# Altium footprint library MyPcbLib.PcbLib: 222 footprints (part 3 of 14)
Each footprint in its own frame and in the unit in brackets; x right, y up, seen from the top. Pads: shape width x height; smd on the part's side, far side on the other; paste and mask are expansions set on the pad; w line width, h text height; cw(c..) or ccw(c..) is an arc to the next point about the centre after c.
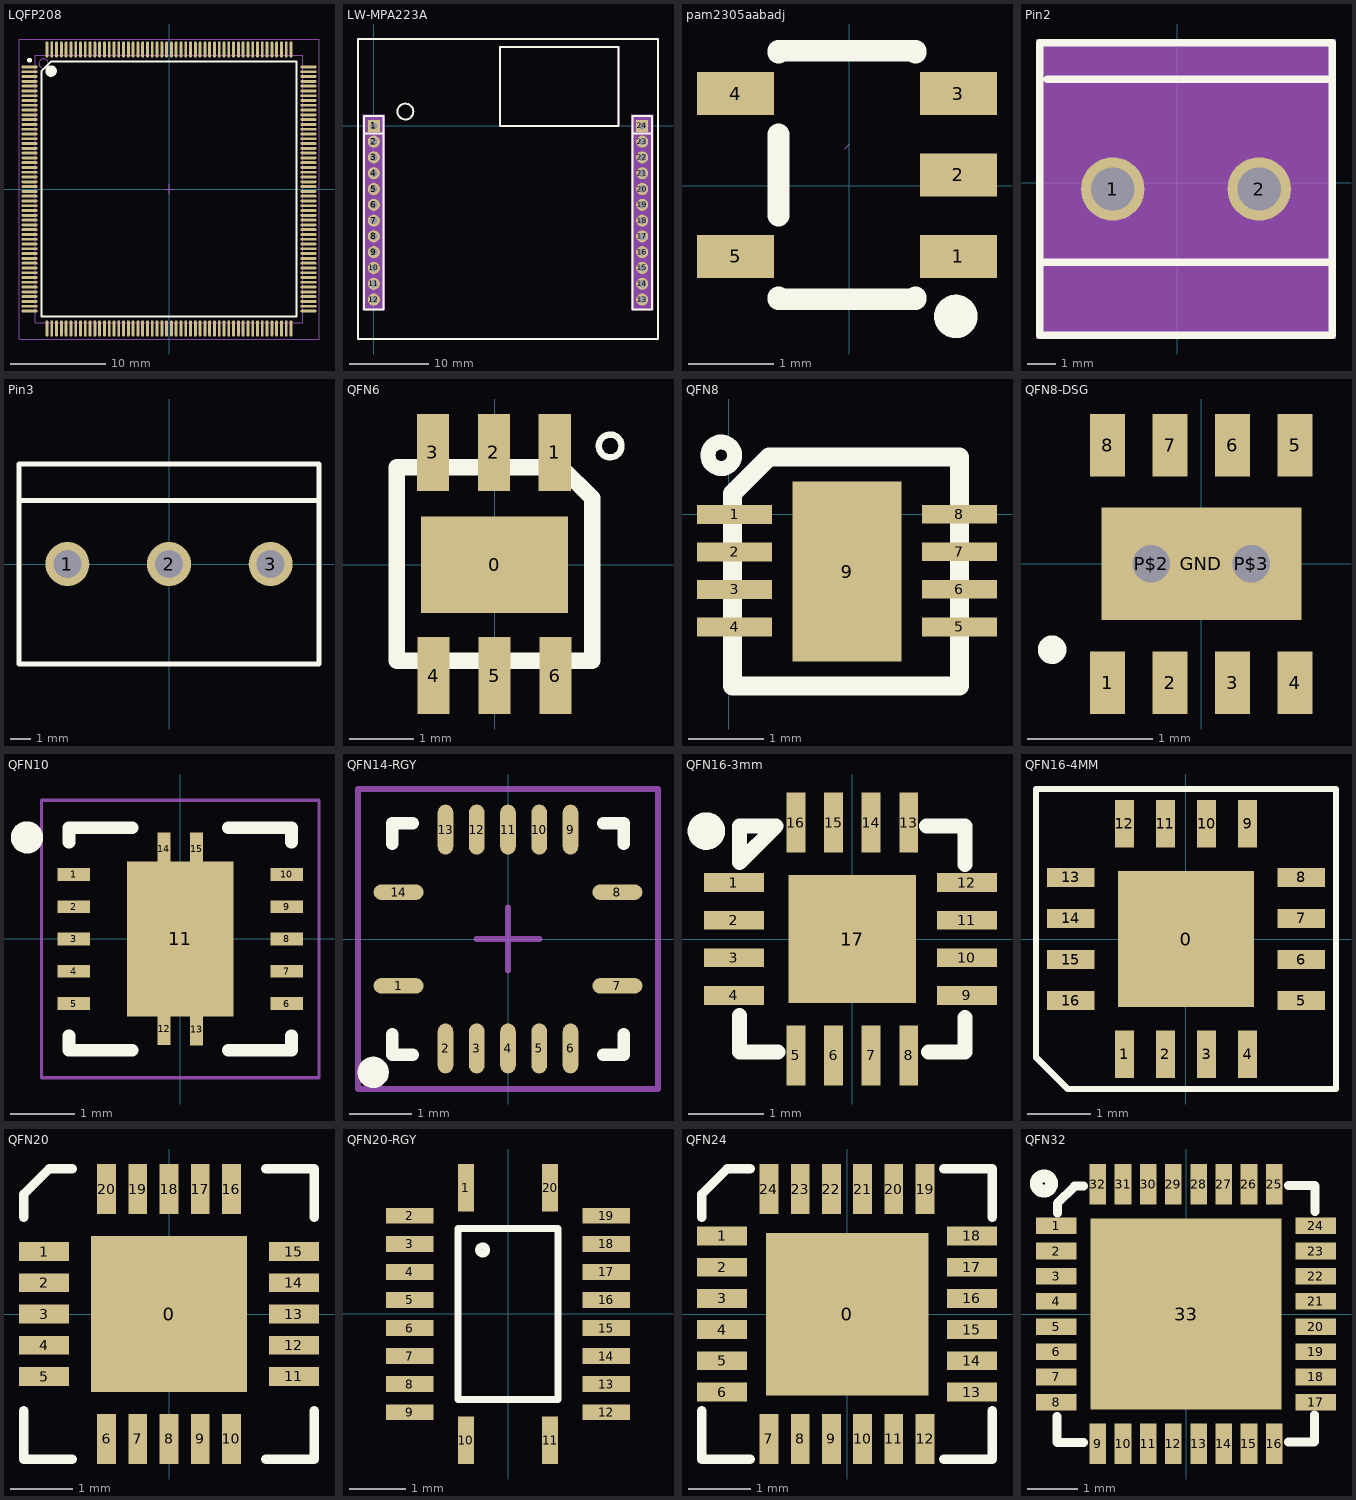
[diagram p2: the footprints below, top view; thin cyan lines are the x and y axes]

## LQFP208 [mm] "TSQFP, 208-Leads, Body 28.00x28.00mm, Pitch 0.50mm, IPC Medium Density"
height 1.6
pads (208):
  oval 1.7x0.3 smd: 1(-14.575,12.75) 2(-14.575,12.25) 3(-14.575,11.75) 4(-14.575,11.25) 5(-14.575,10.75) 6(-14.575,10.25) 7(-14.575,9.75) 8(-14.575,9.25) 9(-14.575,8.75) 10(-14.575,8.25) 11(-14.575,7.75) 12(-14.575,7.25) 13(-14.575,6.75) 14(-14.575,6.25) 15(-14.575,5.75) 16(-14.575,5.25) 17(-14.575,4.75) 18(-14.575,4.25) 19(-14.575,3.75) 20(-14.575,3.25) 21(-14.575,2.75) 22(-14.575,2.25) 23(-14.575,1.75) 24(-14.575,1.25) 25(-14.575,0.75) 26(-14.575,0.25) 27(-14.575,-0.25) 28(-14.575,-0.75) 29(-14.575,-1.25) 30(-14.575,-1.75) 31(-14.575,-2.25) 32(-14.575,-2.75) 33(-14.575,-3.25) 34(-14.575,-3.75) 35(-14.575,-4.25) 36(-14.575,-4.75) 37(-14.575,-5.25) 38(-14.575,-5.75) 39(-14.575,-6.25) 40(-14.575,-6.75) 41(-14.575,-7.25) 42(-14.575,-7.75) 43(-14.575,-8.25) 44(-14.575,-8.75) 45(-14.575,-9.25) 46(-14.575,-9.75) 47(-14.575,-10.25) 48(-14.575,-10.75) 49(-14.575,-11.25) 50(-14.575,-11.75) 51(-14.575,-12.25) 52(-14.575,-12.75) 105(14.575,-12.75) 106(14.575,-12.25) 107(14.575,-11.75) 108(14.575,-11.25) 109(14.575,-10.75) 110(14.575,-10.25) 111(14.575,-9.75) 112(14.575,-9.25) 113(14.575,-8.75) 114(14.575,-8.25) 115(14.575,-7.75) 116(14.575,-7.25) 117(14.575,-6.75) 118(14.575,-6.25) 119(14.575,-5.75) 120(14.575,-5.25) 121(14.575,-4.75) 122(14.575,-4.25) 123(14.575,-3.75) 124(14.575,-3.25) 125(14.575,-2.75) 126(14.575,-2.25) 127(14.575,-1.75) 128(14.575,-1.25) 129(14.575,-0.75) 130(14.575,-0.25) 131(14.575,0.25) 132(14.575,0.75) 133(14.575,1.25) 134(14.575,1.75) 135(14.575,2.25) 136(14.575,2.75) 137(14.575,3.25) 138(14.575,3.75) 139(14.575,4.25) 140(14.575,4.75) 141(14.575,5.25) 142(14.575,5.75) 143(14.575,6.25) 144(14.575,6.75) 145(14.575,7.25) 146(14.575,7.75) 147(14.575,8.25) 148(14.575,8.75) 149(14.575,9.25) 150(14.575,9.75) 151(14.575,10.25) 152(14.575,10.75) 153(14.575,11.25) 154(14.575,11.75) 155(14.575,12.25) 156(14.575,12.75)
  oval 0.3x1.7 smd: 53(-12.75,-14.575) 54(-12.25,-14.575) 55(-11.75,-14.575) 56(-11.25,-14.575) 57(-10.75,-14.575) 58(-10.25,-14.575) 59(-9.75,-14.575) 60(-9.25,-14.575) 61(-8.75,-14.575) 62(-8.25,-14.575) 63(-7.75,-14.575) 64(-7.25,-14.575) 65(-6.75,-14.575) 66(-6.25,-14.575) 67(-5.75,-14.575) 68(-5.25,-14.575) 69(-4.75,-14.575) 70(-4.25,-14.575) 71(-3.75,-14.575) 72(-3.25,-14.575) 73(-2.75,-14.575) 74(-2.25,-14.575) 75(-1.75,-14.575) 76(-1.25,-14.575) 77(-0.75,-14.575) 78(-0.25,-14.575) 79(0.25,-14.575) 80(0.75,-14.575) 81(1.25,-14.575) 82(1.75,-14.575) 83(2.25,-14.575) 84(2.75,-14.575) 85(3.25,-14.575) 86(3.75,-14.575) 87(4.25,-14.575) 88(4.75,-14.575) 89(5.25,-14.575) 90(5.75,-14.575) 91(6.25,-14.575) 92(6.75,-14.575) 93(7.25,-14.575) 94(7.75,-14.575) 95(8.25,-14.575) 96(8.75,-14.575) 97(9.25,-14.575) 98(9.75,-14.575) 99(10.25,-14.575) 100(10.75,-14.575) 101(11.25,-14.575) 102(11.75,-14.575) 103(12.25,-14.575) 104(12.75,-14.575) 157(12.75,14.575) 158(12.25,14.575) 159(11.75,14.575) 160(11.25,14.575) 161(10.75,14.575) 162(10.25,14.575) 163(9.75,14.575) 164(9.25,14.575) 165(8.75,14.575) 166(8.25,14.575) 167(7.75,14.575) 168(7.25,14.575) 169(6.75,14.575) 170(6.25,14.575) 171(5.75,14.575) 172(5.25,14.575) 173(4.75,14.575) 174(4.25,14.575) 175(3.75,14.575) 176(3.25,14.575) 177(2.75,14.575) 178(2.25,14.575) 179(1.75,14.575) 180(1.25,14.575) 181(0.75,14.575) 182(0.25,14.575) 183(-0.25,14.575) 184(-0.75,14.575) 185(-1.25,14.575) 186(-1.75,14.575) 187(-2.25,14.575) 188(-2.75,14.575) 189(-3.25,14.575) 190(-3.75,14.575) 191(-4.25,14.575) 192(-4.75,14.575) 193(-5.25,14.575) 194(-5.75,14.575) 195(-6.25,14.575) 196(-6.75,14.575) 197(-7.25,14.575) 198(-7.75,14.575) 199(-8.25,14.575) 200(-8.75,14.575) 201(-9.25,14.575) 202(-9.75,14.575) 203(-10.25,14.575) 204(-10.75,14.575) 205(-11.25,14.575) 206(-11.75,14.575) 207(-12.25,14.575) 208(-12.75,14.575)
Top Overlay:
  circle w0.6: c-12.325,12.325 r0.3
  circle w0.25: c-14.575,13.45 r0.125
  lines w0.2: -13.325,-13.325 -13.325,12.329 -12.329,13.325 13.325,13.325 13.325,-13.325 -13.325,-13.325
Mechanical 13:
  circle w0.1: c-13.1,13.1 r0.5
  lines w0.1: -14,-14 14,-14 14,14 -14,14 -14,-14
Mechanical 15:
  lines w0.05: -15.675,-15.675 15.675,-15.675 15.675,15.675 -15.675,15.675 -15.675,-15.675
  lines w0.1: -0.5,0 0.5,0 ; 0,-0.5 0,0.5
3D body "PQ208.STEP": height 4.15, standoff -0.08, extent -15.309,-15.249 15.291,15.351

## LW-MPA223A [mil]
pads (24):
  rect 60x60 hole 35.43: 1(0,0) 24(1338.58,0)
  round 60 hole 35.43: 2(0,-78.8) 3(0,-157.5) 4(0,-236.3) 5(0,-315) 6(0,-393.7) 7(0,-472.5) 8(0,-551.2) 9(0,-630) 10(0,-708.7) 11(0,-787.4) 12(0,-866.2) 13(1338.58,-866.2) 14(1338.58,-787.4) 15(1338.58,-708.7) 16(1338.58,-630) 17(1338.58,-551.2) 18(1338.58,-472.5) 19(1338.58,-393.7) 20(1338.58,-315) 21(1338.58,-236.3) 22(1338.58,-157.5) 23(1338.58,-78.8)
Top Overlay:
  circle w10: c157.48,71.26 r39.37
  lines w10: -49.21,-39.36 49.21,-39.36 ; 1289.37,-39.36 1387.79,-39.36 ; -78.74,-1062.99 -78.74,433.07 1417.32,433.07 1417.32,-1062.99 1377.95,-1062.99 0,-1062.99 -78.74,-1062.99 ; -49.21,-915.38 -49.21,49.18 49.21,49.18 49.2,-591 49.2,-915.4 -49.21,-915.38 ; 629.92,0 1220.47,0 1220.47,393.7 629.92,393.7 629.92,0 ; 1289.37,-915.38 1387.79,-915.38 1387.78,-591 1387.78,49.2 1289.37,49.18 1289.37,-915.38
Mechanical 1:
  lines w10: 629.92,0 629.92,393.7 1220.47,393.7 1220.47,0 629.92,0
Mechanical 4:
  region: 54.21,54.2 54.21,-920.4 -54.21,-920.4 -54.21,54.2
  region: 1392.79,54.2 1392.79,-920.4 1284.37,-920.4 1284.37,54.2
Mechanical 5:
  circle w13.78: c0,-866.2 r6.89
  circle w13.78: c0,-787.4 r6.89
  circle w13.78: c0,-708.7 r6.89
  circle w13.78: c0,-630 r6.89
  circle w13.78: c0,-551.2 r6.89
  circle w13.78: c0,-472.5 r6.89
  circle w13.78: c0,-393.7 r6.89
  circle w13.78: c0,-315 r6.89
  circle w13.78: c0,-236.3 r6.89
  circle w13.78: c0,-157.5 r6.89
  circle w13.78: c0,-78.8 r6.89
  circle w13.78: c0,0 r6.89
  circle w13.78: c1338.58,0 r6.89
  circle w13.78: c1338.58,-78.8 r6.89
  circle w13.78: c1338.58,-157.5 r6.89
  circle w13.78: c1338.58,-236.3 r6.89
  circle w13.78: c1338.58,-315 r6.89
  circle w13.78: c1338.58,-393.7 r6.89
  circle w13.78: c1338.58,-472.5 r6.89
  circle w13.78: c1338.58,-551.2 r6.89
  circle w13.78: c1338.58,-630 r6.89
  circle w13.78: c1338.58,-708.7 r6.89
  circle w13.78: c1338.58,-787.4 r6.89
  circle w13.78: c1338.58,-866.2 r6.89
Mechanical 6:
  circle w2.36: c-54.21,54.2 r1.18
  circle w2.36: c1284.37,54.2 r1.18
Mechanical 15:
  lines w0.1: 17.55,-431.51 19.55,-433.51 ; 1356.14,-431.51 1358.14,-433.51

## pam2305aabadj [mm]
pads (5):
  rect 0.9x0.5 smd: 1(1.272,-0.823) 2(1.272,0.127) 3(1.272,1.077) 4(-1.328,1.077) 5(-1.328,-0.823)
Top Overlay:
  circle w0.254: c1.242,-1.524 r0.127
  lines w0.254: -0.828,-1.299 -0.828,-1.323 0.772,-1.323 0.772,-1.299 ; -0.828,-0.347 -0.828,0.601 ; -0.828,1.553 -0.828,1.577 0.772,1.577 0.772,1.553
Mechanical 15:
  lines w0.003: -0.053,0.432 -0.003,0.483

## Pin2 [mm]
pads (2):
  round 2.2 hole 1.5: 1(-2.244,-0.211) 2(2.836,-0.211)
Top Overlay:
  lines w0.254: -4.784,-2.751 5.376,-2.751 ; -4.53,3.599 5.376,3.599 ; -4.784,-5.291 5.376,-5.291 5.376,4.869 -4.784,4.869 -4.784,-5.291
Mechanical 4:
  region: -4.911,4.996 5.503,4.996 5.503,-5.418 -4.911,-5.418
Mechanical 5:
  region: 1.736,0.889 3.936,0.889 3.936,-1.311 1.736,-1.311
  region: -3.344,0.889 -1.144,0.889 -1.144,-1.311 -3.344,-1.311
Mechanical 15:
  lines w0.003: 0.059,0.218 0.11,0.269

## Pin3 [mm]
pads (3):
  round 2.2 hole 1.4: 1(-5.08,0) 2(0,0) 3(5.08,0)
Top Overlay:
  lines w0.254: -7.493,3.175 7.366,3.175 ; -7.5,-5 7.5,-5 7.5,5 -7.5,5 -7.5,-5
Mechanical 15:
  lines w0.003: 0.266,0.364 0.317,0.415

## QFN6 [mm] "SOT-23/SC-74A; 5 Leads; Body 3.1 x 3 mm, inc. leads (LxW max)"
height 1.45
pads (7):
  rect 2.3x1.5 smd: 0(0,0)
  rect 0.5x1.2 smd: 1(0.94,1.753) 2(-0.01,1.753) 3(-0.96,1.753) 4(-0.95,-1.727) 5(0,-1.727) 6(0.95,-1.727)
Top Overlay:
  circle w0.1: c1.804,1.854 r0.177
  lines w0.254: -1.524,-1.499 -1.524,1.524 1.041,1.524 1.524,1.041 1.524,-1.499 -1.524,-1.499
3D body: height 1, standoff 0, extent -1.524,-1.499 1.524,1.524

## QFN8 [mm] "SOT-23/SC-74A; 5 Leads; Body 3.1 x 3 mm, inc. leads (LxW max)"
height 1.45
pads (9):
  rect 1x0.25 smd: 1(0.076,0) 2(0.076,-0.5) 3(0.076,-1) 5(3.073,-1.499) 6(3.073,-0.999) 7(3.073,-0.499) 8(3.073,0.001)
  rect 1x0.25 smd paste+0: 4(0.076,-1.5)
  rect 1.45x2.4 smd: 9(1.575,-0.762)
Top Overlay:
  circle w0.2: c-0.101,0.787 r0.177
  lines w0.254: 0.051,-2.286 0.051,0.279 0.533,0.762 3.073,0.762 3.073,-2.286 0.051,-2.286
3D body: height 1, standoff 0, extent 0.051,-2.286 3.073,0.762

## QFN8-DSG [mm]
pads (11):
  rect 0.28x0.5 smd: 1(-0.75,-0.95) 2(-0.25,-0.95) 3(0.25,-0.95) 4(0.75,-0.95) 5(0.75,0.95) 6(0.25,0.95) 7(-0.25,0.95) 8(-0.75,0.95)
  rect 1.6x0.9 smd: GND(0,0)
  rect 0.55x0.55 hole 0.3: P$2(-0.4,0) P$3(0.4,0)
Top Overlay:
  circle w0.127: c-1.194,-0.686 r0.051
3D body "User Library-DSG (S-PWSON-N8).step": height 0.76, standoff -0.04, extent -1.05,-1.041 1.05,1.059

## QFN10 [mm] "QFN, 14-Leads, Body 3.00x3.00mm, Pitch 0.50mm, Thermal Pad 1.63x2.40mm, IPC Medium Density"
height 1
pads (15):
  rect 0.5x0.2 smd: 1(-1.65,1) 2(-1.65,0.5) 3(-1.65,0) 4(-1.65,-0.5) 5(-1.65,-1) 6(1.65,-1) 7(1.65,-0.5) 8(1.65,0) 9(1.65,0.5) 10(1.65,1)
  rect 1.65x2.4 smd: 11(0,0)
  rect 0.2x0.5 smd: 12(-0.25,-1.392) 13(0.254,-1.397) 14(-0.254,1.397) 15(0.254,1.397)
Top Overlay:
  circle w0.25: c-2.375,1.575 r0.125
  lines w0.2: -1.725,-1.5 -1.725,-1.725 -0.75,-1.725 ; -1.725,1.5 -1.725,1.725 -0.75,1.725 ; 0.75,-1.725 1.725,-1.725 1.725,-1.5 ; 0.75,1.725 1.725,1.725 1.725,1.5
Mechanical 15:
  lines w0.05: -2.15,-2.15 2.15,-2.15 2.15,2.15 -2.15,2.15 -2.15,-2.15
  lines w0.1: -0.5,0 0.5,0 ; 0,-0.5 0,0.5
3D body: height 1, standoff 0.05, extent -1.575,-1.575 1.575,1.575
3D body: height 0.2, standoff 0.05, extent 0.152,-1.6 0.33,-1.397
3D body: height 0.2, standoff 0.05, extent -0.343,-1.6 -0.165,-1.397
3D body: height 0.2, standoff 0.05, extent 0.152,1.397 0.33,1.6
3D body: height 0.2, standoff 0.05, extent -0.356,1.397 -0.178,1.6
3D body: height 0.2, standoff 0.05, extent 1.397,-1.092 1.6,-0.914
3D body: height 0.2, standoff 0.05, extent 1.397,-0.584 1.6,-0.406
3D body: height 0.2, standoff 0.05, extent 1.397,-0.076 1.6,0.102
3D body: height 0.2, standoff 0.05, extent 1.397,0.406 1.6,0.584
3D body: height 0.2, standoff 0.05, extent 1.397,0.914 1.6,1.092
3D body: height 0.2, standoff 0.05, extent -1.6,0.914 -1.397,1.092
3D body: height 0.2, standoff 0.05, extent -1.6,0.406 -1.397,0.584
3D body: height 0.2, standoff 0.05, extent -1.6,-0.102 -1.397,0.076
3D body: height 0.2, standoff 0.05, extent -1.6,-0.584 -1.397,-0.406
3D body: height 0.2, standoff 0.05, extent -1.6,-1.092 -1.397,-0.914

## QFN14-RGY [mm] "QFN14-RGY (LIB+=TXS0104E)"
height 1
pads (14):
  oval 0.8x0.25 smd: 1(-1.75,-0.75) 7(1.75,-0.75) 8(1.75,0.75) 14(-1.75,0.75)
  oval 0.25x0.8 smd: 2(-1,-1.75) 3(-0.5,-1.75) 4(0,-1.75) 5(0.5,-1.75) 6(1,-1.75) 9(1,1.75) 10(0.5,1.75) 11(0,1.75) 12(-0.5,1.75) 13(-1,1.75)
Top Overlay:
  circle w0.25: c-2.157,-2.134 r0.125
  lines w0.2: -1.85,-1.525 -1.85,-1.85 -1.525,-1.85 ; -1.85,1.525 -1.85,1.85 -1.525,1.85 ; 1.525,-1.85 1.85,-1.85 1.85,-1.525 ; 1.525,1.85 1.85,1.85 1.85,1.525
Mechanical 15:
  lines w0.1: -0.5,0 0.5,0 ; 0,-0.5 0,0.5 ; -2.4,-2.4 -2.4,2.4 2.4,2.4 2.4,-2.4 -2.4,-2.4
3D body "User Library-QFN-14_Therm.STEP": height 1, standoff 0, extent -1.753,-1.753 1.747,1.747

## QFN16-3mm [mm] "QFN, 16-Leads, Body 3.0x3.0mm (max), Pitch 0.50mm, IPC Low Density"
height 3
pads (17):
  rect 0.8x0.25 smd: 1(-1.575,0.75) 2(-1.575,0.25) 3(-1.575,-0.25) 4(-1.575,-0.75) 9(1.524,-0.75) 10(1.524,-0.25) 11(1.524,0.25) 12(1.524,0.75)
  rect 0.25x0.8 smd: 5(-0.75,-1.55) 6(-0.25,-1.55) 7(0.25,-1.55) 8(0.75,-1.55) 13(0.75,1.55) 14(0.25,1.55) 15(-0.25,1.55) 16(-0.75,1.55)
  rect 1.7x1.7 smd: 17(0,0)
Top Overlay:
  circle w0.25: c-1.941,1.436 r0.125
  lines w0.2: -1.5,-1.015 -1.5,-1.5 -0.989,-1.5 ; 0.989,1.5 1.5,1.5 1.5,0.989 ; 1.016,-1.5 1.5,-1.5 1.5,-1.041 ; -1.5,1.016 -1.5,1.5 -1.016,1.5 -1.5,1.016
3D body "QFN-16_3x3.STEP": height 0.9, standoff 0, extent -1.549,-1.521 1.493,1.521

## QFN16-4MM [mm] "LNA"
height 5.33
pads (17):
  rect 2.15x2.15 smd: 0(0,0)
  rect 0.3x0.75 smd: 1(-0.975,-1.825) 2(-0.325,-1.825) 3(0.325,-1.825) 4(0.975,-1.825) 9(0.975,1.825) 10(0.325,1.825) 11(-0.325,1.825) 12(-0.975,1.825)
  rect 0.75x0.3 smd: 5(1.825,-0.975) 6(1.825,-0.325) 7(1.825,0.325) 8(1.825,0.975) 13(-1.825,0.975) 14(-1.825,0.325) 15(-1.825,-0.325) 16(-1.825,-0.975)
Top Overlay:
  lines w0.1: -1.025,2.375 2.375,2.375 2.375,-2.375 -1.525,-2.375 -1.875,-2.375 -2.375,-1.875 -2.375,-1.425 -2.375,2.375 -0.4,2.375
3D body "QFN16.step": height 0.85, standoff 0, extent -2.001,-1.981 2.001,2.021

## QFN20 [mm]
pads (21):
  rect 2.5x2.5 smd: 0(0,0)
  rect 0.8x0.3 smd: 1(-2,1) 2(-2,0.5) 3(-2,0) 4(-2,-0.5) 5(-2,-1) 11(2,-1) 12(2,-0.5) 13(2,0) 14(2,0.5) 15(2,1)
  rect 0.3x0.8 smd: 6(-1,-2) 7(-0.5,-2) 8(0,-2) 9(0.5,-2) 10(1,-2) 16(1,2) 17(0.5,2) 18(0,2) 19(-0.5,2) 20(-1,2)
Top Overlay:
  lines w0.15: -2.325,-1.55 -2.325,-2.325 -1.55,-2.325 ; -2.325,1.55 -2.325,1.917 -1.917,2.325 -1.55,2.325 ; 1.55,-2.325 2.325,-2.325 2.325,-1.55 ; 1.55,2.325 2.325,2.325 2.325,1.55
3D body "QFN-20.STEP": height 0.62, standoff -0.08, extent -1.501,-1.5 1.499,1.5

## QFN20-RGY [mm]
pads (20):
  rect 0.28x0.85 smd: 1(-0.75,2.25) 10(-0.75,-2.25) 11(0.75,-2.25) 20(0.75,2.25)
  rect 0.85x0.28 smd: 2(-1.75,1.75) 3(-1.75,1.25) 4(-1.75,0.75) 5(-1.75,0.25) 6(-1.75,-0.25) 7(-1.75,-0.75) 8(-1.75,-1.25) 9(-1.75,-1.75) 12(1.75,-1.75) 13(1.75,-1.25) 14(1.75,-0.75) 15(1.75,-0.25) 16(1.75,0.25) 17(1.75,0.75) 18(1.75,1.25) 19(1.75,1.75)
Top Overlay:
  circle w0.127: c-0.452,1.143 r0.071
  lines w0.127: -0.889,-1.524 0.889,-1.524 0.889,1.524 -0.889,1.524 -0.889,-1.524
3D body "User Library-DHVQFN20.STEP": height 1, standoff 0, extent -1.22,-2.26 1.3,2.26

## QFN24 [mm]
pads (25):
  rect 2.6x2.6 smd: 0(0.005,0)
  rect 0.8x0.3 smd: 1(-2,1.25) 2(-2,0.75) 3(-2,0.25) 4(-2,-0.25) 5(-2,-0.75) 6(-2,-1.25) 13(2,-1.25) 14(2,-0.75) 15(2,-0.25) 16(2,0.25) 17(2,0.75) 18(2,1.25)
  rect 0.3x0.8 smd: 7(-1.25,-2) 8(-0.75,-2) 9(-0.25,-2) 10(0.25,-2) 11(0.75,-2) 12(1.25,-2) 19(1.25,2) 20(0.75,2) 21(0.25,2) 22(-0.25,2) 23(-0.75,2) 24(-1.25,2)
Top Overlay:
  lines w0.15: -2.325,-1.55 -2.325,-2.325 -1.55,-2.325 ; -2.325,1.55 -2.325,1.917 -1.917,2.325 -1.55,2.325 ; 1.55,-2.325 2.325,-2.325 2.325,-1.55 ; 1.55,2.325 2.325,2.325 2.325,1.55
3D body "QFN24.step": height 0.9, standoff 0, extent -1.997,-2.002 2.007,2.002

## QFN32 [mil]
pads (33):
  rect 31.5x13 smd: 1(-101.5,68.92) 2(-101.5,49.23) 3(-101.5,29.54) 4(-101.5,9.85) 5(-101.5,-9.85) 6(-101.5,-29.54) 7(-101.5,-49.23) 8(-101.5,-68.92) 17(101.5,-68.92) 18(101.5,-49.23) 19(101.5,-29.54) 20(101.5,-9.85) 21(101.5,9.85) 22(101.5,29.54) 23(101.5,49.23) 24(101.5,68.92)
  rect 13x31.5 smd: 9(-68.92,-101.5) 10(-49.23,-101.5) 11(-29.54,-101.5) 12(-9.85,-101.5) 13(9.85,-101.5) 14(29.54,-101.5) 15(49.23,-101.5) 16(68.92,-101.5) 25(68.92,101.5) 26(49.23,101.5) 27(29.54,101.5) 28(9.85,101.5) 29(-9.85,101.5) 30(-29.54,101.5) 31(-49.23,101.5) 32(-68.92,101.5)
  rect 149.61x149.61 smd: 33(0,0)
Top Overlay:
  circle w10: c-111,102 r6
  lines w7: -101,-80 -101,-100 -100.5,-100.5 -80,-100.5 ; -100.5,79 -100.5,86.5 -87,100 -80,100 ; 80,-100 100,-100 100.5,-99.5 100.5,-79 ; 80,100.5 100.5,100.5 101,100 101,80
3D body "qfn32-5x5.step": height 31.5, standoff 0, extent -98.2,-98.81 99.44,98.82